# Altium footprint library BBC_Connectors.PcbLib: 141 footprints (part 1 of 9)
Each footprint in its own frame and in the unit in brackets; x right, y up, seen from the top. Pads: shape width x height; smd on the part's side, far side on the other; paste and mask are expansions set on the pad; w line width, h text height; cw(c..) or ccw(c..) is an arc to the next point about the centre after c.
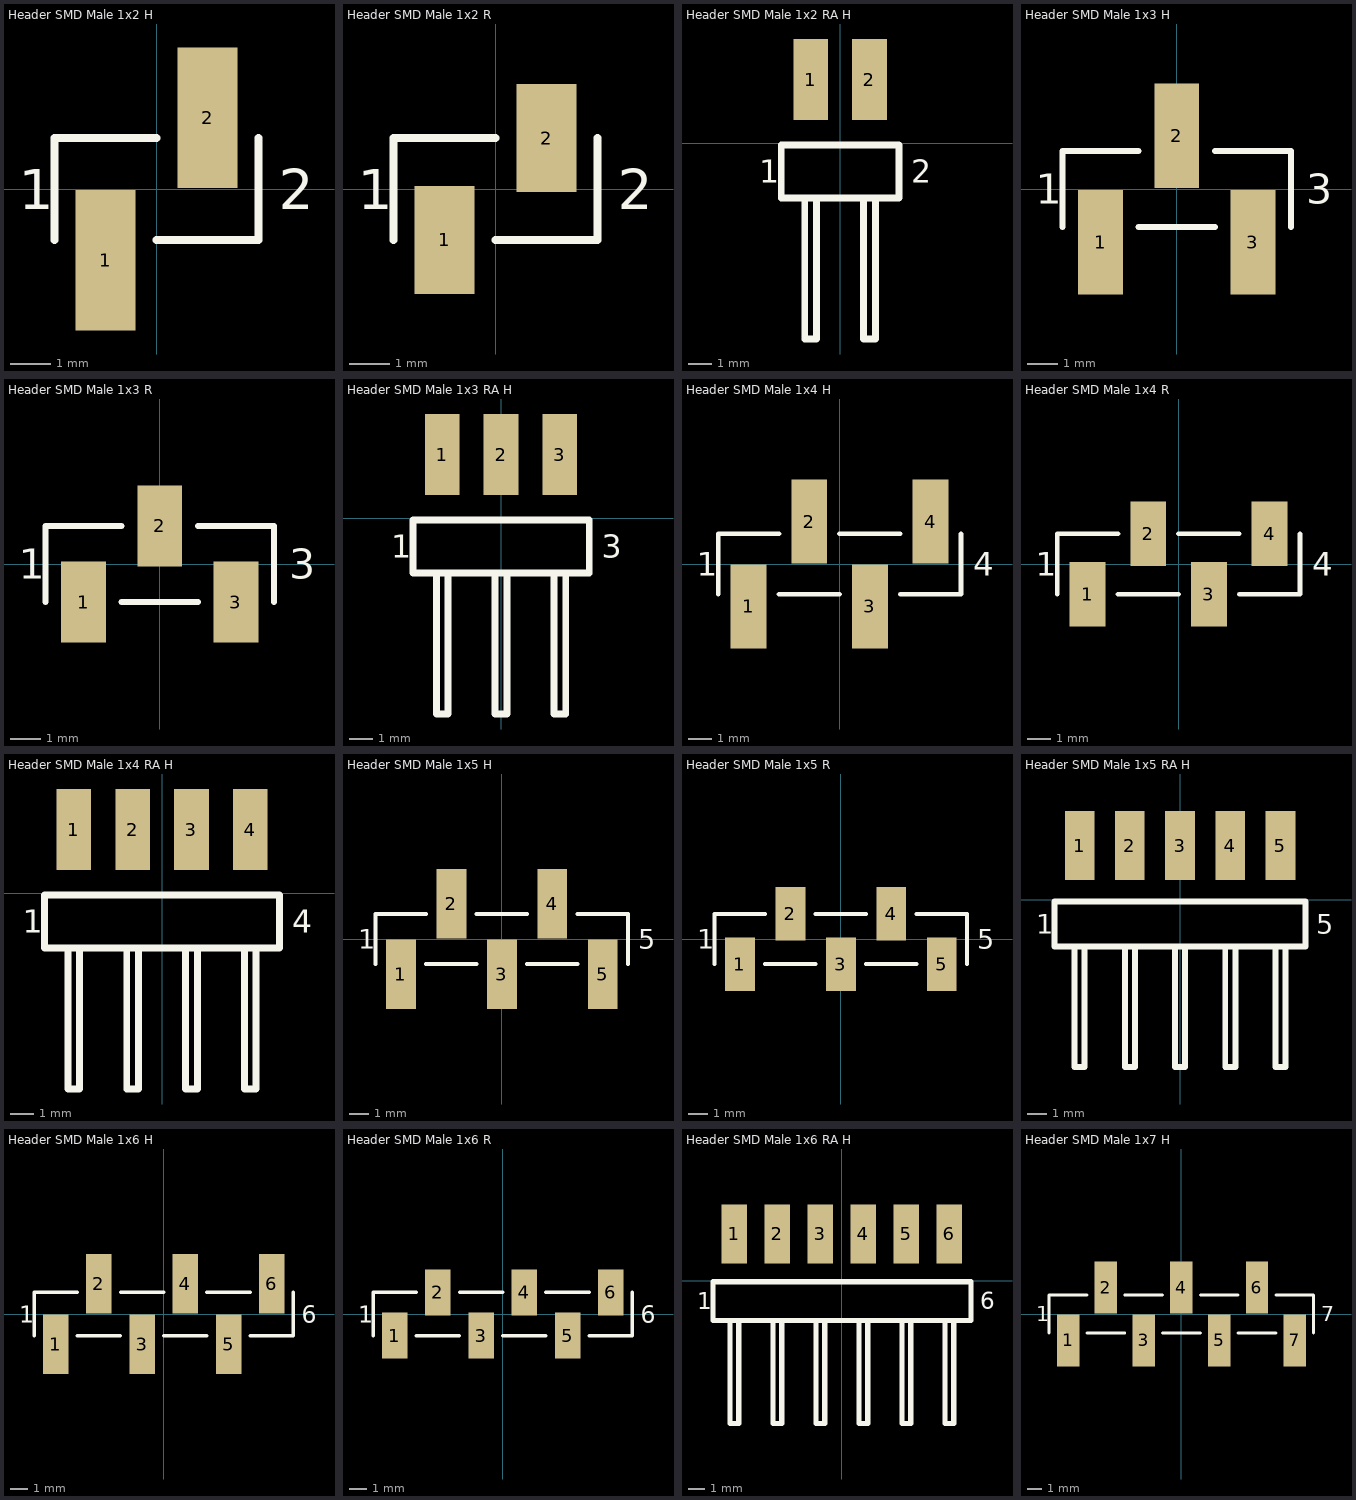
[diagram p0: the footprints below, top view; thin cyan lines are the x and y axes]

## Header SMD Male 1x2 H [mm] "male header for smd mounting / pitch = 2.54mm / hand soldering"
height 11
pads (2):
  rect 1.5x3.5 smd: 1(-1.27,-1.778) 2(1.27,1.778)
Top Overlay:
  lines w0.2: -2.54,-1.27 -2.54,1.27 0,1.27 ; 0,-1.27 2.54,-1.27 2.54,1.27
  text "1" at -3.429,-0.5 h1
  text "2" at 3.048,-0.5 h1
3D body "Header SMD Male 1x2.step": height 8.78, standoff -0.04, extent -2.572,-2.412 2.508,2.436

## Header SMD Male 1x2 R [mm] "male header for smd mounting / pitch = 2.54mm / reflow soldering"
height 11
pads (2):
  rect 1.5x2.7 smd: 1(-1.27,-1.27) 2(1.27,1.27)
Top Overlay:
  lines w0.2: -2.54,-1.27 -2.54,1.27 0,1.27 ; 0,-1.27 2.54,-1.27 2.54,1.27
  text "2" at 3.048,-0.5 h1
  text "1" at -3.429,-0.5 h1
3D body "Header SMD Male 1x2.step": height 8.78, standoff -0.04, extent -2.572,-2.412 2.508,2.436

## Header SMD Male 1x2 RA H [mm] "right angled male header for smd mounting / pitch = 2.54mm / hand soldering"
height 11
pads (2):
  rect 1.5x3.5 smd: 1(-1.27,2.75) 2(1.27,2.75)
Top Overlay:
  lines w0.3: -1.524,-2.36 -1.524,-8.456 -1.016,-8.456 -1.016,-2.36 ; 1.016,-2.36 1.016,-8.456 1.524,-8.456 1.524,-2.36 ; -2.54,-2.36 -2.54,-0.074 2.54,-0.074 2.54,-2.36 -2.54,-2.36
  text "2" at 3.08,-1.7 h1
  text "1" at -3.48,-1.7 h1
3D body "Header SMD Male 1x2 RA.stp": height 2.52, standoff 0.02, extent -2.54,-8.5 2.54,3

## Header SMD Male 1x3 H [mm] "male header for smd mounting / pitch = 2.54mm / hand soldering"
height 11
pads (3):
  rect 1.5x3.5 smd: 1(-2.54,-1.778) 2(0,1.778) 3(2.54,-1.778)
Top Overlay:
  lines w0.2: -3.81,-1.27 -3.81,1.27 -1.27,1.27 ; -1.27,-1.27 1.27,-1.27 ; 1.27,1.27 3.81,1.27 3.81,-1.27
  text "1" at -4.699,-0.5 h1
  text "3" at 4.318,-0.5 h1
3D body "Header SMD Male 1x3.step": height 8.78, standoff -0.04, extent -3.842,-2.412 3.778,2.436

## Header SMD Male 1x3 R [mm] "male header for smd mounting / pitch = 2.54mm / reflow soldering"
height 11
pads (3):
  rect 1.5x2.7 smd: 1(-2.54,-1.27) 2(0,1.27) 3(2.54,-1.27)
Top Overlay:
  lines w0.2: -3.81,-1.27 -3.81,1.27 -1.27,1.27 ; -1.27,-1.27 1.27,-1.27 ; 1.27,1.27 3.81,1.27 3.81,-1.27
  text "3" at 4.318,-0.5 h1
  text "1" at -4.699,-0.5 h1
3D body "Header SMD Male 1x3.step": height 8.78, standoff -0.04, extent -3.842,-2.412 3.778,2.436

## Header SMD Male 1x3 RA H [mm] "right angled male header for smd mounting / pitch = 2.54mm / hand soldering"
height 11
pads (3):
  rect 1.5x3.5 smd: 1(-2.54,2.75) 2(0,2.75) 3(2.54,2.75)
Top Overlay:
  lines w0.3: -2.794,-2.36 -2.794,-8.456 -2.286,-8.456 -2.286,-2.36 ; -0.254,-2.36 -0.254,-8.456 0.254,-8.456 0.254,-2.36 ; 2.286,-2.36 2.286,-8.456 2.794,-8.456 2.794,-2.36 ; -3.81,-2.36 3.81,-2.36 3.81,-0.074 -3.81,-0.074 -3.81,-2.36
  text "3" at 4.35,-1.7 h1
  text "1" at -4.75,-1.7 h1
3D body "Header SMD Male 1x3 RA.stp": height 2.52, standoff 0.02, extent -3.81,-8.5 3.81,3

## Header SMD Male 1x4 H [mm] "male header for smd mounting / pitch = 2.54mm / hand soldering"
height 11
pads (4):
  rect 1.5x3.5 smd: 1(-3.81,-1.778) 2(-1.27,1.778) 3(1.27,-1.778) 4(3.81,1.778)
Top Overlay:
  lines w0.2: -5.08,-1.27 -5.08,1.27 -2.54,1.27 ; -2.54,-1.27 0,-1.27 ; 0,1.27 2.54,1.27 ; 2.54,-1.27 5.08,-1.27 5.08,1.27
  text "4" at 5.588,-0.488 h1
  text "1" at -5.969,-0.488 h1
3D body "Header SMD Male 1x4.STEP": height 8.78, standoff -0.04, extent -5.112,-2.412 5.048,2.436

## Header SMD Male 1x4 R [mm] "male header for smd mounting / pitch = 2.54mm / reflow soldering"
height 11
pads (4):
  rect 1.5x2.7 smd: 1(-3.81,-1.27) 2(-1.27,1.27) 3(1.27,-1.27) 4(3.81,1.27)
Top Overlay:
  lines w0.2: -5.08,-1.27 -5.08,1.27 -2.54,1.27 ; -2.54,-1.27 0,-1.27 ; 0,1.27 2.54,1.27 ; 2.54,-1.27 5.08,-1.27 5.08,1.27
  text "1" at -5.969,-0.488 h1
  text "4" at 5.588,-0.488 h1
3D body "Header SMD Male 1x4.STEP": height 8.78, standoff -0.04, extent -5.112,-2.412 5.048,2.436

## Header SMD Male 1x4 RA H [mm] "right angled male header for smd mounting / pitch = 2.54mm / hand soldering"
height 11
pads (4):
  rect 1.5x3.5 smd: 1(-3.81,2.75) 2(-1.27,2.75) 3(1.27,2.75) 4(3.81,2.75)
Top Overlay:
  lines w0.3: -4.064,-2.36 -4.064,-8.456 -3.556,-8.456 -3.556,-2.36 ; -1.524,-2.36 -1.524,-8.456 -1.016,-8.456 -1.016,-2.36 ; 1.016,-2.36 1.016,-8.456 1.524,-8.456 1.524,-2.36 ; 3.556,-2.36 3.556,-8.456 4.064,-8.456 4.064,-2.36 ; -5.08,-2.36 -5.08,-0.074 5.08,-0.074 5.08,-2.36 -5.08,-2.36
  text "4" at 5.62,-1.7 h1
  text "1" at -6.02,-1.7 h1
3D body "Header SMD Male 1x4 RA.stp": height 2.52, standoff 0.02, extent -5.08,-8.5 5.08,3

## Header SMD Male 1x5 H [mm] "male header for smd mounting / pitch = 2.54mm / hand soldering"
height 11
pads (5):
  rect 1.5x3.5 smd: 1(-5.08,-1.778) 2(-2.54,1.778) 3(0,-1.778) 4(2.54,1.778) 5(5.08,-1.778)
Top Overlay:
  lines w0.2: -6.35,-1.27 -6.35,1.27 -3.81,1.27 ; -3.81,-1.27 -1.27,-1.27 ; -1.27,1.27 1.27,1.27 ; 1.27,-1.27 3.81,-1.27 ; 3.81,1.27 6.35,1.27 6.35,-1.27
  text "1" at -7.239,-0.488 h1
  text "5" at 6.858,-0.488 h1
3D body "Header SMD Male 1x5.step": height 8.78, standoff -0.04, extent -6.382,-2.412 6.318,2.436

## Header SMD Male 1x5 R [mm] "male header for smd mounting / pitch = 2.54mm / reflow soldering"
height 11
pads (5):
  rect 1.5x2.7 smd: 1(-5.08,-1.27) 2(-2.54,1.27) 3(0,-1.27) 4(2.54,1.27) 5(5.08,-1.27)
Top Overlay:
  lines w0.2: -6.35,-1.27 -6.35,1.27 -3.81,1.27 ; -3.81,-1.27 -1.27,-1.27 ; -1.27,1.27 1.27,1.27 ; 1.27,-1.27 3.81,-1.27 ; 3.81,1.27 6.35,1.27 6.35,-1.27
  text "5" at 6.858,-0.488 h1
  text "1" at -7.239,-0.488 h1
3D body "Header SMD Male 1x5.step": height 8.78, standoff -0.04, extent -6.382,-2.412 6.318,2.436

## Header SMD Male 1x5 RA H [mm] "right angled male header for smd mounting / pitch = 2.54mm / hand soldering"
height 11
pads (5):
  rect 1.5x3.5 smd: 1(-5.08,2.75) 2(-2.54,2.75) 3(0,2.75) 4(2.54,2.75) 5(5.08,2.75)
Top Overlay:
  lines w0.3: -5.334,-2.36 -5.334,-8.456 -4.826,-8.456 -4.826,-2.36 ; -2.794,-2.36 -2.794,-8.456 -2.286,-8.456 -2.286,-2.36 ; -0.254,-2.36 -0.254,-8.456 0.254,-8.456 0.254,-2.36 ; 2.286,-2.36 2.286,-8.456 2.794,-8.456 2.794,-2.36 ; 4.826,-2.36 4.826,-8.456 5.334,-8.456 5.334,-2.36 ; -6.35,-2.36 6.35,-2.36 6.35,-0.074 -6.35,-0.074 -6.35,-2.36
  text "1" at -7.29,-1.7 h1
  text "5" at 6.89,-1.7 h1
3D body "Header SMD Male 1x5 RA.stp": height 2.52, standoff 0.02, extent -6.35,-8.5 6.35,3

## Header SMD Male 1x6 H [mm] "male header for smd mounting / pitch = 2.54mm / hand soldering"
height 11
pads (6):
  rect 1.5x3.5 smd: 1(-6.35,-1.778) 2(-3.81,1.778) 3(-1.27,-1.778) 4(1.27,1.778) 5(3.81,-1.778) 6(6.35,1.778)
Top Overlay:
  lines w0.2: -7.62,-1.27 -7.62,1.27 -5.08,1.27 ; -5.08,-1.27 -2.54,-1.27 ; -2.54,1.27 0,1.27 ; 0,-1.27 2.54,-1.27 ; 2.54,1.27 5.08,1.27 ; 5.08,-1.27 7.62,-1.27 7.62,1.27
  text "1" at -8.509,-0.5 h1
  text "6" at 8.128,-0.5 h1
3D body "Header SMD Male 1x6.step": height 8.78, standoff -0.04, extent -7.652,-2.412 7.588,2.436

## Header SMD Male 1x6 R [mm] "male header for smd mounting / pitch = 2.54mm / reflow soldering"
height 11
pads (6):
  rect 1.5x2.7 smd: 1(-6.35,-1.27) 2(-3.81,1.27) 3(-1.27,-1.27) 4(1.27,1.27) 5(3.81,-1.27) 6(6.35,1.27)
Top Overlay:
  lines w0.2: -7.62,-1.27 -7.62,1.27 -5.08,1.27 ; -5.08,-1.27 -2.54,-1.27 ; -2.54,1.27 0,1.27 ; 0,-1.27 2.54,-1.27 ; 2.54,1.27 5.08,1.27 ; 5.08,-1.27 7.62,-1.27 7.62,1.27
  text "1" at -8.509,-0.5 h1
  text "6" at 8.128,-0.5 h1
3D body "Header SMD Male 1x6.step": height 8.78, standoff -0.04, extent -7.652,-2.412 7.588,2.436

## Header SMD Male 1x6 RA H [mm] "right angled male header for smd mounting / pitch = 2.54mm / hand soldering"
height 11
pads (6):
  rect 1.5x3.5 smd: 1(-6.35,2.75) 2(-3.81,2.75) 3(-1.27,2.75) 4(1.27,2.75) 5(3.81,2.75) 6(6.35,2.75)
Top Overlay:
  lines w0.3: -6.604,-2.36 -6.604,-8.456 -6.096,-8.456 -6.096,-2.36 ; -4.064,-2.36 -4.064,-8.456 -3.556,-8.456 -3.556,-2.36 ; -1.524,-2.36 -1.524,-8.456 -1.016,-8.456 -1.016,-2.36 ; 1.016,-2.36 1.016,-8.456 1.524,-8.456 1.524,-2.36 ; 3.556,-2.36 3.556,-8.456 4.064,-8.456 4.064,-2.36 ; 6.096,-2.36 6.096,-8.456 6.604,-8.456 6.604,-2.36 ; -7.62,-2.36 7.62,-2.36 7.62,-0.074 -7.62,-0.074 -7.62,-2.36
  text "6" at 8.16,-1.7 h1
  text "1" at -8.56,-1.7 h1
3D body "Header SMD Male 1x6 RA.stp": height 2.52, standoff 0.02, extent -7.62,-8.5 7.62,3

## Header SMD Male 1x7 H [mm] "male header for smd mounting / pitch = 2.54mm / hand soldering"
height 11
pads (7):
  rect 1.5x3.5 smd: 1(-7.62,-1.778) 2(-5.08,1.778) 3(-2.54,-1.778) 4(0,1.778) 5(2.54,-1.778) 6(5.08,1.778) 7(7.62,-1.778)
Top Overlay:
  lines w0.2: -8.89,-1.27 -8.89,1.27 -6.35,1.27 ; -6.35,-1.27 -3.81,-1.27 ; -3.81,1.27 -1.27,1.27 ; -1.27,-1.27 1.27,-1.27 ; 1.27,1.27 3.81,1.27 ; 3.81,-1.27 6.35,-1.27 ; 6.35,1.27 8.89,1.27 8.89,-1.27
  text "1" at -9.779,-0.5 h1
  text "7" at 9.398,-0.5 h1
3D body "Header SMD Male 1x7.step": height 8.78, standoff -0.04, extent -8.922,-2.412 8.858,2.436